# Altium schematic symbol library Kondensator_DIP.SchLib: 1521 symbols (part 3 of 4) (continued)
## Ê50-35-33ÌÊÔ-250Â-1325
designator C?  (value not drawn)
Value: *
footprint Ê50-35-1320_K5035-1R
footprint Ê50-35-1320_K5035-1R1
footprint Ê50-35-1320_Primary
pins: 1, 2

## Ê50-35-33ÌÊÔ-250Â-1325-Ã
designator C?  (value not drawn)
Value: *
footprint Ê50-35-13XX-Ã_K5035-1R
footprint Ê50-35-13XX-Ã_K5035-1R1
footprint Ê50-35-13XX-Ã_Primary
pins: 1, 2

## Ê50-35-33ÌÊÔ-350Â-1326
designator C?  (value not drawn)
Value: *
footprint Ê50-35-1320_K5035-1R
footprint Ê50-35-1320_K5035-1R1
footprint Ê50-35-1320_Primary
pins: 1, 2

## Ê50-35-33ÌÊÔ-350Â-1326-Ã
designator C?  (value not drawn)
Value: *
footprint Ê50-35-13XX-Ã_K5035-1R
footprint Ê50-35-13XX-Ã_K5035-1R1
footprint Ê50-35-13XX-Ã_Primary
pins: 1, 2

## Ê50-35-33ÌÊÔ-350Â-1626
designator C?  (value not drawn)
Value: *
footprint Ê50-35-1625_K5035-1R
footprint Ê50-35-1625_K5035-1R1
footprint Ê50-35-1625_Primary
pins: 1, 2

## Ê50-35-33ÌÊÔ-350Â-1626-Ã
designator C?  (value not drawn)
Value: *
footprint Ê50-35-16XX-Ã_K5035-1R
footprint Ê50-35-16XX-Ã_K5035-1R1
footprint Ê50-35-16XX-Ã_Primary
pins: 1, 2

## Ê50-35-33ÌÊÔ-400Â-1625
designator C?  (value not drawn)
Value: *
footprint Ê50-35-1625_K5035-1R
footprint Ê50-35-1625_K5035-1R1
footprint Ê50-35-1625_Primary
pins: 1, 2

## Ê50-35-33ÌÊÔ-400Â-1625-Ã
designator C?  (value not drawn)
Value: *
footprint Ê50-35-16XX-Ã_K5035-1R
footprint Ê50-35-16XX-Ã_K5035-1R1
footprint Ê50-35-16XX-Ã_Primary
pins: 1, 2

## Ê50-35-33ÌÊÔ-400Â-1633
designator C?  (value not drawn)
Value: *
footprint Ê50-35-1625_K5035-1R
footprint Ê50-35-1625_K5035-1R1
footprint Ê50-35-1625_Primary
pins: 1, 2

## Ê50-35-33ÌÊÔ-400Â-1633-Ã
designator C?  (value not drawn)
Value: *
footprint Ê50-35-16XX-Ã_K5035-1R
footprint Ê50-35-16XX-Ã_K5035-1R1
footprint Ê50-35-16XX-Ã_Primary
pins: 1, 2

## Ê50-35-33ÌÊÔ-450Â-1632
designator C?  (value not drawn)
Value: *
footprint Ê50-35-1625_K5035-1R
footprint Ê50-35-1625_K5035-1R1
footprint Ê50-35-1625_Primary
pins: 1, 2

## Ê50-35-33ÌÊÔ-450Â-1632-Ã
designator C?  (value not drawn)
Value: *
footprint Ê50-35-16XX-Ã_K5035-1R
footprint Ê50-35-16XX-Ã_K5035-1R1
footprint Ê50-35-16XX-Ã_Primary
pins: 1, 2

## Ê50-35-33ÌÊÔ-450Â-1635
designator C?  (value not drawn)
Value: *
footprint Ê50-35-1625_K5035-1R
footprint Ê50-35-1625_K5035-1R1
footprint Ê50-35-1625_Primary
pins: 1, 2

## Ê50-35-33ÌÊÔ-450Â-1635-Ã
designator C?  (value not drawn)
Value: *
footprint Ê50-35-16XX-Ã_K5035-1R
footprint Ê50-35-16XX-Ã_K5035-1R1
footprint Ê50-35-16XX-Ã_Primary
pins: 1, 2

## Ê50-35-47ÌÊÔ-6,3Â
designator C?  (value not drawn)
Value: *
footprint Ê50-35-0511_K5035-1R
footprint Ê50-35-0511_K5035-1R1
footprint Ê50-35-0511_Primary
pins: 1, 2

## Ê50-35-47ÌÊÔ-6.3Â-Ã
designator C?  (value not drawn)
Value: *
footprint Ê50-35-0511-Ã_K5035-1R
footprint Ê50-35-0511-Ã_K5035-1R1
footprint Ê50-35-0511-Ã_Primary
pins: 1, 2

## Ê50-35-47ÌÊÔ-10Â
designator C?  (value not drawn)
Value: *
footprint Ê50-35-0511_K5035-1R
footprint Ê50-35-0511_K5035-1R1
footprint Ê50-35-0511_Primary
pins: 1, 2

## Ê50-35-47ÌÊÔ-10Â-Ã
designator C?  (value not drawn)
Value: *
footprint Ê50-35-0511-Ã_K5035-1R
footprint Ê50-35-0511-Ã_K5035-1R1
footprint Ê50-35-0511-Ã_Primary
pins: 1, 2

## Ê50-35-47ÌÊÔ-16Â
designator C?  (value not drawn)
Value: *
footprint Ê50-35-0511_K5035-1R
footprint Ê50-35-0511_K5035-1R1
footprint Ê50-35-0511_Primary
pins: 1, 2

## Ê50-35-47ÌÊÔ-16Â-Ã
designator C?  (value not drawn)
Value: *
footprint Ê50-35-0511-Ã_K5035-1R
footprint Ê50-35-0511-Ã_K5035-1R1
footprint Ê50-35-0511-Ã_Primary
pins: 1, 2

## Ê50-35-47ÌÊÔ-25Â
designator C?  (value not drawn)
Value: *
footprint Ê50-35-0511_K5035-1R
footprint Ê50-35-0511_K5035-1R1
footprint Ê50-35-0511_Primary
pins: 1, 2

## Ê50-35-47ÌÊÔ-25Â-Ã
designator C?  (value not drawn)
Value: *
footprint Ê50-35-0511-Ã_K5035-1R
footprint Ê50-35-0511-Ã_K5035-1R1
footprint Ê50-35-0511-Ã_Primary
pins: 1, 2

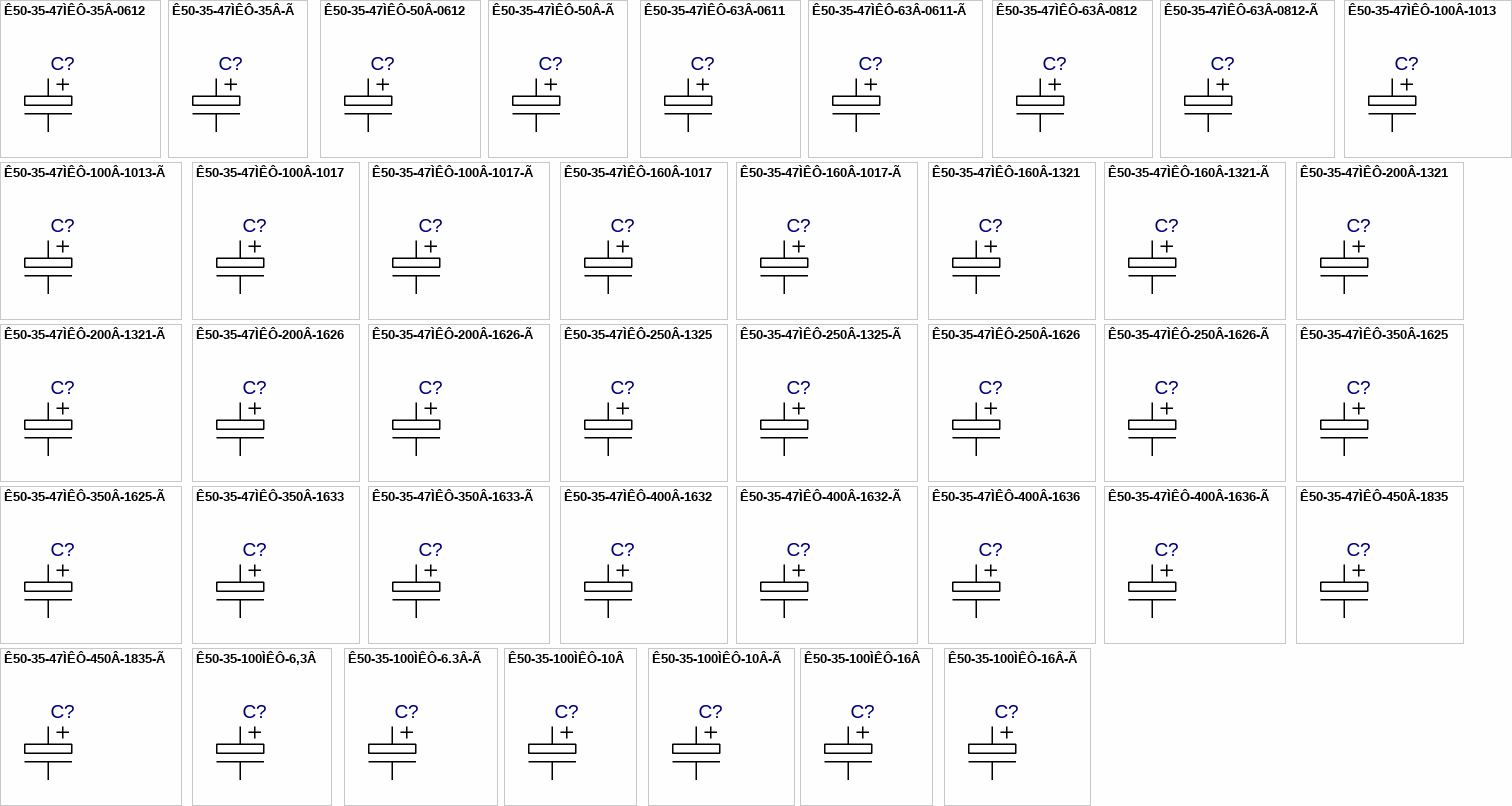
[diagram p28: symbols Ê50-35-47ÌÊÔ-35Â-0612 to Ê50-35-100ÌÊÔ-16Â-Ã]

## Ê50-35-47ÌÊÔ-35Â-0612
designator C?  (value not drawn)
Value: *
footprint Ê50-35-0611_K5035-1R
footprint Ê50-35-0611_K5035-1R1
footprint Ê50-35-0611_Primary
pins: 1, 2

## Ê50-35-47ÌÊÔ-35Â-Ã
designator C?  (value not drawn)
Value: *
footprint Ê50-35-0611-Ã_K5035-1R
footprint Ê50-35-0611-Ã_K5035-1R1
footprint Ê50-35-0611-Ã_Primary
pins: 1, 2

## Ê50-35-47ÌÊÔ-50Â-0612
designator C?  (value not drawn)
Value: *
footprint Ê50-35-0611_K5035-1R
footprint Ê50-35-0611_K5035-1R1
footprint Ê50-35-0611_Primary
pins: 1, 2

## Ê50-35-47ÌÊÔ-50Â-Ã
designator C?  (value not drawn)
Value: *
footprint Ê50-35-0611-Ã_K5035-1R
footprint Ê50-35-0611-Ã_K5035-1R1
footprint Ê50-35-0611-Ã_Primary
pins: 1, 2

## Ê50-35-47ÌÊÔ-63Â-0611
designator C?  (value not drawn)
Value: *
footprint Ê50-35-0611_K5035-1R
footprint Ê50-35-0611_K5035-1R1
footprint Ê50-35-0611_Primary
pins: 1, 2

## Ê50-35-47ÌÊÔ-63Â-0611-Ã
designator C?  (value not drawn)
Value: *
footprint Ê50-35-0611-Ã_K5035-1R
footprint Ê50-35-0611-Ã_K5035-1R1
footprint Ê50-35-0611-Ã_Primary
pins: 1, 2

## Ê50-35-47ÌÊÔ-63Â-0812
designator C?  (value not drawn)
Value: *
footprint R50-35-08XX_K5035-2R
footprint R50-35-08XX_K5035-2R1
footprint R50-35-08XX_Primary
pins: 1, 2

## Ê50-35-47ÌÊÔ-63Â-0812-Ã
designator C?  (value not drawn)
Value: *
footprint Ê50-35-08XX-Ã_K5035-2R
footprint Ê50-35-08XX-Ã_K5035-2R1
footprint Ê50-35-08XX-Ã_Primary
pins: 1, 2

## Ê50-35-47ÌÊÔ-100Â-1013
designator C?  (value not drawn)
Value: *
footprint Ê50-35-1020_K5035-1R
footprint Ê50-35-1020_K5035-1R1
footprint Ê50-35-1020_Primary
pins: 1, 2

## Ê50-35-47ÌÊÔ-100Â-1013-Ã
designator C?  (value not drawn)
Value: *
footprint Ê50-35-1020-Ã_K5035-1R
footprint Ê50-35-1020-Ã_K5035-1R1
footprint Ê50-35-1020-Ã_Primary
pins: 1, 2

## Ê50-35-47ÌÊÔ-100Â-1017
designator C?  (value not drawn)
Value: *
footprint Ê50-35-1020_K5035-1R
footprint Ê50-35-1020_K5035-1R1
footprint Ê50-35-1020_Primary
pins: 1, 2

## Ê50-35-47ÌÊÔ-100Â-1017-Ã
designator C?  (value not drawn)
Value: *
footprint Ê50-35-1020-Ã_K5035-1R
footprint Ê50-35-1020-Ã_K5035-1R1
footprint Ê50-35-1020-Ã_Primary
pins: 1, 2

## Ê50-35-47ÌÊÔ-160Â-1017
designator C?  (value not drawn)
Value: *
footprint Ê50-35-1020_K5035-1R
footprint Ê50-35-1020_K5035-1R1
footprint Ê50-35-1020_Primary
pins: 1, 2

## Ê50-35-47ÌÊÔ-160Â-1017-Ã
designator C?  (value not drawn)
Value: *
footprint Ê50-35-1020-Ã_K5035-1R
footprint Ê50-35-1020-Ã_K5035-1R1
footprint Ê50-35-1020-Ã_Primary
pins: 1, 2

## Ê50-35-47ÌÊÔ-160Â-1321
designator C?  (value not drawn)
Value: *
footprint Ê50-35-1320_K5035-1R
footprint Ê50-35-1320_K5035-1R1
footprint Ê50-35-1320_Primary
pins: 1, 2

## Ê50-35-47ÌÊÔ-160Â-1321-Ã
designator C?  (value not drawn)
Value: *
footprint Ê50-35-13XX-Ã_K5035-1R
footprint Ê50-35-13XX-Ã_K5035-1R1
footprint Ê50-35-13XX-Ã_Primary
pins: 1, 2

## Ê50-35-47ÌÊÔ-200Â-1321
designator C?  (value not drawn)
Value: *
footprint Ê50-35-1320_K5035-1R
footprint Ê50-35-1320_K5035-1R1
footprint Ê50-35-1320_Primary
pins: 1, 2

## Ê50-35-47ÌÊÔ-200Â-1321-Ã
designator C?  (value not drawn)
Value: *
footprint Ê50-35-13XX-Ã_K5035-1R
footprint Ê50-35-13XX-Ã_K5035-1R1
footprint Ê50-35-13XX-Ã_Primary
pins: 1, 2

## Ê50-35-47ÌÊÔ-200Â-1626
designator C?  (value not drawn)
Value: *
footprint Ê50-35-1625_K5035-1R
footprint Ê50-35-1625_K5035-1R1
footprint Ê50-35-1625_Primary
pins: 1, 2

## Ê50-35-47ÌÊÔ-200Â-1626-Ã
designator C?  (value not drawn)
Value: *
footprint Ê50-35-16XX-Ã_K5035-1R
footprint Ê50-35-16XX-Ã_K5035-1R1
footprint Ê50-35-16XX-Ã_Primary
pins: 1, 2

## Ê50-35-47ÌÊÔ-250Â-1325
designator C?  (value not drawn)
Value: *
footprint Ê50-35-1320_K5035-1R
footprint Ê50-35-1320_K5035-1R1
footprint Ê50-35-1320_Primary
pins: 1, 2

## Ê50-35-47ÌÊÔ-250Â-1325-Ã
designator C?  (value not drawn)
Value: *
footprint Ê50-35-13XX-Ã_K5035-1R
footprint Ê50-35-13XX-Ã_K5035-1R1
footprint Ê50-35-13XX-Ã_Primary
pins: 1, 2

## Ê50-35-47ÌÊÔ-250Â-1626
designator C?  (value not drawn)
Value: *
footprint Ê50-35-1625_K5035-1R
footprint Ê50-35-1625_K5035-1R1
footprint Ê50-35-1625_Primary
pins: 1, 2

## Ê50-35-47ÌÊÔ-250Â-1626-Ã
designator C?  (value not drawn)
Value: *
footprint Ê50-35-16XX-Ã_K5035-1R
footprint Ê50-35-16XX-Ã_K5035-1R1
footprint Ê50-35-16XX-Ã_Primary
pins: 1, 2

## Ê50-35-47ÌÊÔ-350Â-1625
designator C?  (value not drawn)
Value: *
footprint Ê50-35-1625_K5035-1R
footprint Ê50-35-1625_K5035-1R1
footprint Ê50-35-1625_Primary
pins: 1, 2

## Ê50-35-47ÌÊÔ-350Â-1625-Ã
designator C?  (value not drawn)
Value: *
footprint Ê50-35-16XX-Ã_K5035-1R
footprint Ê50-35-16XX-Ã_K5035-1R1
footprint Ê50-35-16XX-Ã_Primary
pins: 1, 2

## Ê50-35-47ÌÊÔ-350Â-1633
designator C?  (value not drawn)
Value: *
footprint Ê50-35-1625_K5035-1R
footprint Ê50-35-1625_K5035-1R1
footprint Ê50-35-1625_Primary
pins: 1, 2

## Ê50-35-47ÌÊÔ-350Â-1633-Ã
designator C?  (value not drawn)
Value: *
footprint Ê50-35-16XX-Ã_K5035-1R
footprint Ê50-35-16XX-Ã_K5035-1R1
footprint Ê50-35-16XX-Ã_Primary
pins: 1, 2

## Ê50-35-47ÌÊÔ-400Â-1632
designator C?  (value not drawn)
Value: *
footprint Ê50-35-1625_K5035-1R
footprint Ê50-35-1625_K5035-1R1
footprint Ê50-35-1625_Primary
pins: 1, 2

## Ê50-35-47ÌÊÔ-400Â-1632-Ã
designator C?  (value not drawn)
Value: *
footprint Ê50-35-16XX-Ã_K5035-1R
footprint Ê50-35-16XX-Ã_K5035-1R1
footprint Ê50-35-16XX-Ã_Primary
pins: 1, 2

## Ê50-35-47ÌÊÔ-400Â-1636
designator C?  (value not drawn)
Value: *
footprint Ê50-35-1625_K5035-1R
footprint Ê50-35-1625_K5035-1R1
footprint Ê50-35-1625_Primary
pins: 1, 2

## Ê50-35-47ÌÊÔ-400Â-1636-Ã
designator C?  (value not drawn)
Value: *
footprint Ê50-35-16XX-Ã_K5035-1R
footprint Ê50-35-16XX-Ã_K5035-1R1
footprint Ê50-35-16XX-Ã_Primary
pins: 1, 2

## Ê50-35-47ÌÊÔ-450Â-1835
designator C?  (value not drawn)
Value: *
footprint Ê50-35-1835_K5035-1R
footprint Ê50-35-1835_K5035-1R1
footprint Ê50-35-1835_Primary
pins: 1, 2

## Ê50-35-47ÌÊÔ-450Â-1835-Ã
designator C?  (value not drawn)
Value: *
footprint Ê50-35-18XX-Ã_K5035-1R
footprint Ê50-35-18XX-Ã_K5035-1R1
footprint Ê50-35-18XX-Ã_Primary
pins: 1, 2

## Ê50-35-100ÌÊÔ-6,3Â
designator C?  (value not drawn)
Value: *
footprint Ê50-35-0511_K5035-1R
footprint Ê50-35-0511_K5035-1R1
footprint Ê50-35-0511_Primary
pins: 1, 2

## Ê50-35-100ÌÊÔ-6.3Â-Ã
designator C?  (value not drawn)
Value: *
footprint Ê50-35-0511-Ã_K5035-1R
footprint Ê50-35-0511-Ã_K5035-1R1
footprint Ê50-35-0511-Ã_Primary
pins: 1, 2

## Ê50-35-100ÌÊÔ-10Â
designator C?  (value not drawn)
Value: *
footprint Ê50-35-0511_K5035-1R
footprint Ê50-35-0511_K5035-1R1
footprint Ê50-35-0511_Primary
pins: 1, 2

## Ê50-35-100ÌÊÔ-10Â-Ã
designator C?  (value not drawn)
Value: *
footprint Ê50-35-0511-Ã_K5035-1R
footprint Ê50-35-0511-Ã_K5035-1R1
footprint Ê50-35-0511-Ã_Primary
pins: 1, 2

## Ê50-35-100ÌÊÔ-16Â
designator C?  (value not drawn)
Value: *
footprint Ê50-35-0511_K5035-1R
footprint Ê50-35-0511_K5035-1R1
footprint Ê50-35-0511_Primary
pins: 1, 2

## Ê50-35-100ÌÊÔ-16Â-Ã
designator C?  (value not drawn)
Value: *
footprint Ê50-35-0511-Ã_K5035-1R
footprint Ê50-35-0511-Ã_K5035-1R1
footprint Ê50-35-0511-Ã_Primary
pins: 1, 2

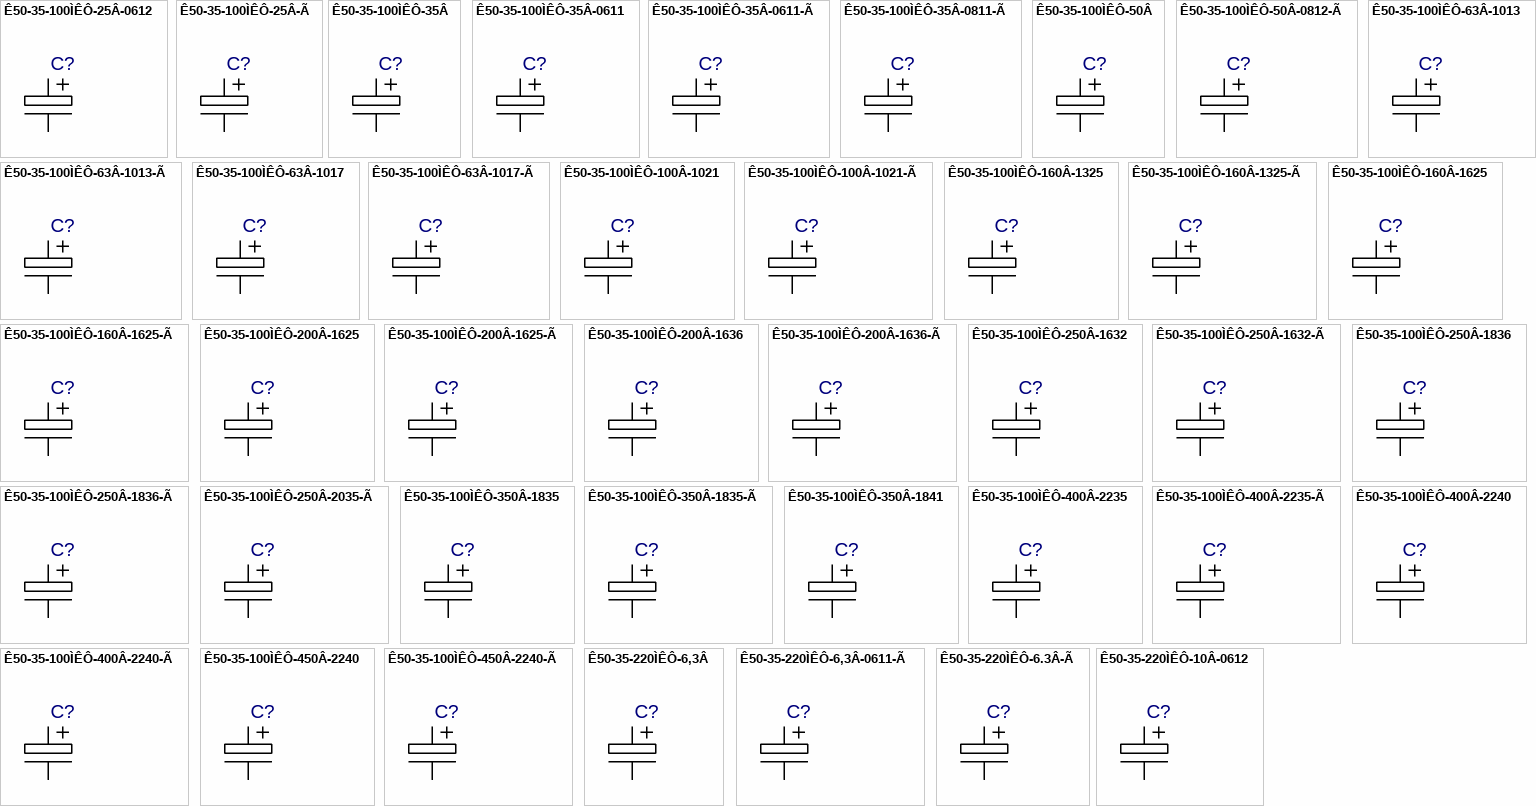
[diagram p29: symbols Ê50-35-100ÌÊÔ-25Â-0612 to Ê50-35-220ÌÊÔ-10Â-0612]

## Ê50-35-100ÌÊÔ-25Â-0612
designator C?  (value not drawn)
Value: *
footprint Ê50-35-0611_K5035-1R
footprint Ê50-35-0611_K5035-1R1
footprint Ê50-35-0611_Primary
pins: 1, 2

## Ê50-35-100ÌÊÔ-25Â-Ã
designator C?  (value not drawn)
Value: *
footprint Ê50-35-0611-Ã_K5035-1R
footprint Ê50-35-0611-Ã_K5035-1R1
footprint Ê50-35-0611-Ã_Primary
pins: 1, 2

## Ê50-35-100ÌÊÔ-35Â
designator C?  (value not drawn)
Value: *
footprint R50-35-08XX_K5035-2R
footprint R50-35-08XX_K5035-2R1
footprint R50-35-08XX_Primary
pins: 1, 2

## Ê50-35-100ÌÊÔ-35Â-0611
designator C?  (value not drawn)
Value: *
footprint Ê50-35-0611_K5035-1R
footprint Ê50-35-0611_K5035-1R1
footprint Ê50-35-0611_Primary
pins: 1, 2

## Ê50-35-100ÌÊÔ-35Â-0611-Ã
designator C?  (value not drawn)
Value: *
footprint Ê50-35-0611-Ã_K5035-1R
footprint Ê50-35-0611-Ã_K5035-1R1
footprint Ê50-35-0611-Ã_Primary
pins: 1, 2

## Ê50-35-100ÌÊÔ-35Â-0811-Ã
designator C?  (value not drawn)
Value: *
footprint Ê50-35-08XX-Ã_K5035-2R
footprint Ê50-35-08XX-Ã_K5035-2R1
footprint Ê50-35-08XX-Ã_Primary
pins: 1, 2

## Ê50-35-100ÌÊÔ-50Â
designator C?  (value not drawn)
Value: *
footprint R50-35-08XX_K5035-2R
footprint R50-35-08XX_K5035-2R1
footprint R50-35-08XX_Primary
pins: 1, 2

## Ê50-35-100ÌÊÔ-50Â-0812-Ã
designator C?  (value not drawn)
Value: *
footprint Ê50-35-08XX-Ã_K5035-2R
footprint Ê50-35-08XX-Ã_K5035-2R1
footprint Ê50-35-08XX-Ã_Primary
pins: 1, 2

## Ê50-35-100ÌÊÔ-63Â-1013
designator C?  (value not drawn)
Value: *
footprint Ê50-35-1020_K5035-1R
footprint Ê50-35-1020_K5035-1R1
footprint Ê50-35-1020_Primary
pins: 1, 2

## Ê50-35-100ÌÊÔ-63Â-1013-Ã
designator C?  (value not drawn)
Value: *
footprint Ê50-35-1020-Ã_K5035-1R
footprint Ê50-35-1020-Ã_K5035-1R1
footprint Ê50-35-1020-Ã_Primary
pins: 1, 2

## Ê50-35-100ÌÊÔ-63Â-1017
designator C?  (value not drawn)
Value: *
footprint Ê50-35-1020_K5035-1R
footprint Ê50-35-1020_K5035-1R1
footprint Ê50-35-1020_Primary
pins: 1, 2

## Ê50-35-100ÌÊÔ-63Â-1017-Ã
designator C?  (value not drawn)
Value: *
footprint Ê50-35-1020-Ã_K5035-1R
footprint Ê50-35-1020-Ã_K5035-1R1
footprint Ê50-35-1020-Ã_Primary
pins: 1, 2

## Ê50-35-100ÌÊÔ-100Â-1021
designator C?  (value not drawn)
Value: *
footprint Ê50-35-1020_K5035-1R
footprint Ê50-35-1020_K5035-1R1
footprint Ê50-35-1020_Primary
pins: 1, 2

## Ê50-35-100ÌÊÔ-100Â-1021-Ã
designator C?  (value not drawn)
Value: *
footprint Ê50-35-1020-Ã_K5035-1R
footprint Ê50-35-1020-Ã_K5035-1R1
footprint Ê50-35-1020-Ã_Primary
pins: 1, 2

## Ê50-35-100ÌÊÔ-160Â-1325
designator C?  (value not drawn)
Value: *
footprint Ê50-35-1320_K5035-1R
footprint Ê50-35-1320_K5035-1R1
footprint Ê50-35-1320_Primary
pins: 1, 2

## Ê50-35-100ÌÊÔ-160Â-1325-Ã
designator C?  (value not drawn)
Value: *
footprint Ê50-35-13XX-Ã_K5035-1R
footprint Ê50-35-13XX-Ã_K5035-1R1
footprint Ê50-35-13XX-Ã_Primary
pins: 1, 2

## Ê50-35-100ÌÊÔ-160Â-1625
designator C?  (value not drawn)
Value: *
footprint Ê50-35-1625_K5035-1R
footprint Ê50-35-1625_K5035-1R1
footprint Ê50-35-1625_Primary
pins: 1, 2

## Ê50-35-100ÌÊÔ-160Â-1625-Ã
designator C?  (value not drawn)
Value: *
footprint Ê50-35-16XX-Ã_K5035-1R
footprint Ê50-35-16XX-Ã_K5035-1R1
footprint Ê50-35-16XX-Ã_Primary
pins: 1, 2

## Ê50-35-100ÌÊÔ-200Â-1625
designator C?  (value not drawn)
Value: *
footprint Ê50-35-1625_K5035-1R
footprint Ê50-35-1625_K5035-1R1
footprint Ê50-35-1625_Primary
pins: 1, 2

## Ê50-35-100ÌÊÔ-200Â-1625-Ã
designator C?  (value not drawn)
Value: *
footprint Ê50-35-16XX-Ã_K5035-1R
footprint Ê50-35-16XX-Ã_K5035-1R1
footprint Ê50-35-16XX-Ã_Primary
pins: 1, 2

## Ê50-35-100ÌÊÔ-200Â-1636
designator C?  (value not drawn)
Value: *
footprint Ê50-35-1625_K5035-1R
footprint Ê50-35-1625_K5035-1R1
footprint Ê50-35-1625_Primary
pins: 1, 2

## Ê50-35-100ÌÊÔ-200Â-1636-Ã
designator C?  (value not drawn)
Value: *
footprint Ê50-35-16XX-Ã_K5035-1R
footprint Ê50-35-16XX-Ã_K5035-1R1
footprint Ê50-35-16XX-Ã_Primary
pins: 1, 2

## Ê50-35-100ÌÊÔ-250Â-1632
designator C?  (value not drawn)
Value: *
footprint Ê50-35-1625_K5035-1R
footprint Ê50-35-1625_K5035-1R1
footprint Ê50-35-1625_Primary
pins: 1, 2

## Ê50-35-100ÌÊÔ-250Â-1632-Ã
designator C?  (value not drawn)
Value: *
footprint Ê50-35-16XX-Ã_K5035-1R
footprint Ê50-35-16XX-Ã_K5035-1R1
footprint Ê50-35-16XX-Ã_Primary
pins: 1, 2

## Ê50-35-100ÌÊÔ-250Â-1836
designator C?  (value not drawn)
Value: *
footprint Ê50-35-1835_K5035-1R
footprint Ê50-35-1835_K5035-1R1
footprint Ê50-35-1835_Primary
pins: 1, 2

## Ê50-35-100ÌÊÔ-250Â-1836-Ã
designator C?  (value not drawn)
Value: *
footprint Ê50-35-18XX-Ã_K5035-1R
footprint Ê50-35-18XX-Ã_K5035-1R1
footprint Ê50-35-18XX-Ã_Primary
pins: 1, 2

## Ê50-35-100ÌÊÔ-250Â-2035-Ã
designator C?  (value not drawn)
Value: *
footprint Ê50-35-20XX-Ã_K5035-1R
footprint Ê50-35-20XX-Ã_K5035-1R1
footprint Ê50-35-20XX-Ã_Primary
pins: 1, 2

## Ê50-35-100ÌÊÔ-350Â-1835
designator C?  (value not drawn)
Value: *
footprint Ê50-35-1835_K5035-1R
footprint Ê50-35-1835_K5035-1R1
footprint Ê50-35-1835_Primary
pins: 1, 2

## Ê50-35-100ÌÊÔ-350Â-1835-Ã
designator C?  (value not drawn)
Value: *
footprint Ê50-35-18XX-Ã_K5035-1R
footprint Ê50-35-18XX-Ã_K5035-1R1
footprint Ê50-35-18XX-Ã_Primary
pins: 1, 2

## Ê50-35-100ÌÊÔ-350Â-1841
designator C?  (value not drawn)
Value: *
footprint Ê50-35-1835_K5035-1R
footprint Ê50-35-1835_K5035-1R1
footprint Ê50-35-1835_Primary
pins: 1, 2

## Ê50-35-100ÌÊÔ-400Â-2235
designator C?  (value not drawn)
Value: *
footprint Ê50-35-2240_K5035-1R
footprint Ê50-35-2240_K5035-1R1
footprint Ê50-35-2240_Primary
pins: 1, 2

## Ê50-35-100ÌÊÔ-400Â-2235-Ã
designator C?  (value not drawn)
Value: *
footprint Ê50-35-22XX-Ã_K5035-1R
footprint Ê50-35-22XX-Ã_K5035-1R1
footprint Ê50-35-22XX-Ã_Primary
pins: 1, 2

## Ê50-35-100ÌÊÔ-400Â-2240
designator C?  (value not drawn)
Value: *
footprint Ê50-35-2240_K5035-1R
footprint Ê50-35-2240_K5035-1R1
footprint Ê50-35-2240_Primary
pins: 1, 2

## Ê50-35-100ÌÊÔ-400Â-2240-Ã
designator C?  (value not drawn)
Value: *
footprint Ê50-35-22XX-Ã_K5035-1R
footprint Ê50-35-22XX-Ã_K5035-1R1
footprint Ê50-35-22XX-Ã_Primary
pins: 1, 2

## Ê50-35-100ÌÊÔ-450Â-2240
designator C?  (value not drawn)
Value: *
footprint Ê50-35-2240_K5035-1R
footprint Ê50-35-2240_K5035-1R1
footprint Ê50-35-2240_Primary
pins: 1, 2

## Ê50-35-100ÌÊÔ-450Â-2240-Ã
designator C?  (value not drawn)
Value: *
footprint Ê50-35-22XX-Ã_K5035-1R
footprint Ê50-35-22XX-Ã_K5035-1R1
footprint Ê50-35-22XX-Ã_Primary
pins: 1, 2

## Ê50-35-220ÌÊÔ-6,3Â
designator C?  (value not drawn)
Value: *
footprint Ê50-35-0511_K5035-1R
footprint Ê50-35-0511_K5035-1R1
footprint Ê50-35-0511_Primary
pins: 1, 2

## Ê50-35-220ÌÊÔ-6,3Â-0611-Ã
designator C?  (value not drawn)
Value: *
footprint Ê50-35-0611-Ã_K5035-1R
footprint Ê50-35-0611-Ã_K5035-1R1
footprint Ê50-35-0611-Ã_Primary
pins: 1, 2

## Ê50-35-220ÌÊÔ-6.3Â-Ã
designator C?  (value not drawn)
Value: *
footprint Ê50-35-0511-Ã_K5035-1R
footprint Ê50-35-0511-Ã_K5035-1R1
footprint Ê50-35-0511-Ã_Primary
pins: 1, 2

## Ê50-35-220ÌÊÔ-10Â-0612
designator C?  (value not drawn)
Value: *
footprint Ê50-35-0611_K5035-1R
footprint Ê50-35-0611_K5035-1R1
footprint Ê50-35-0611_Primary
pins: 1, 2

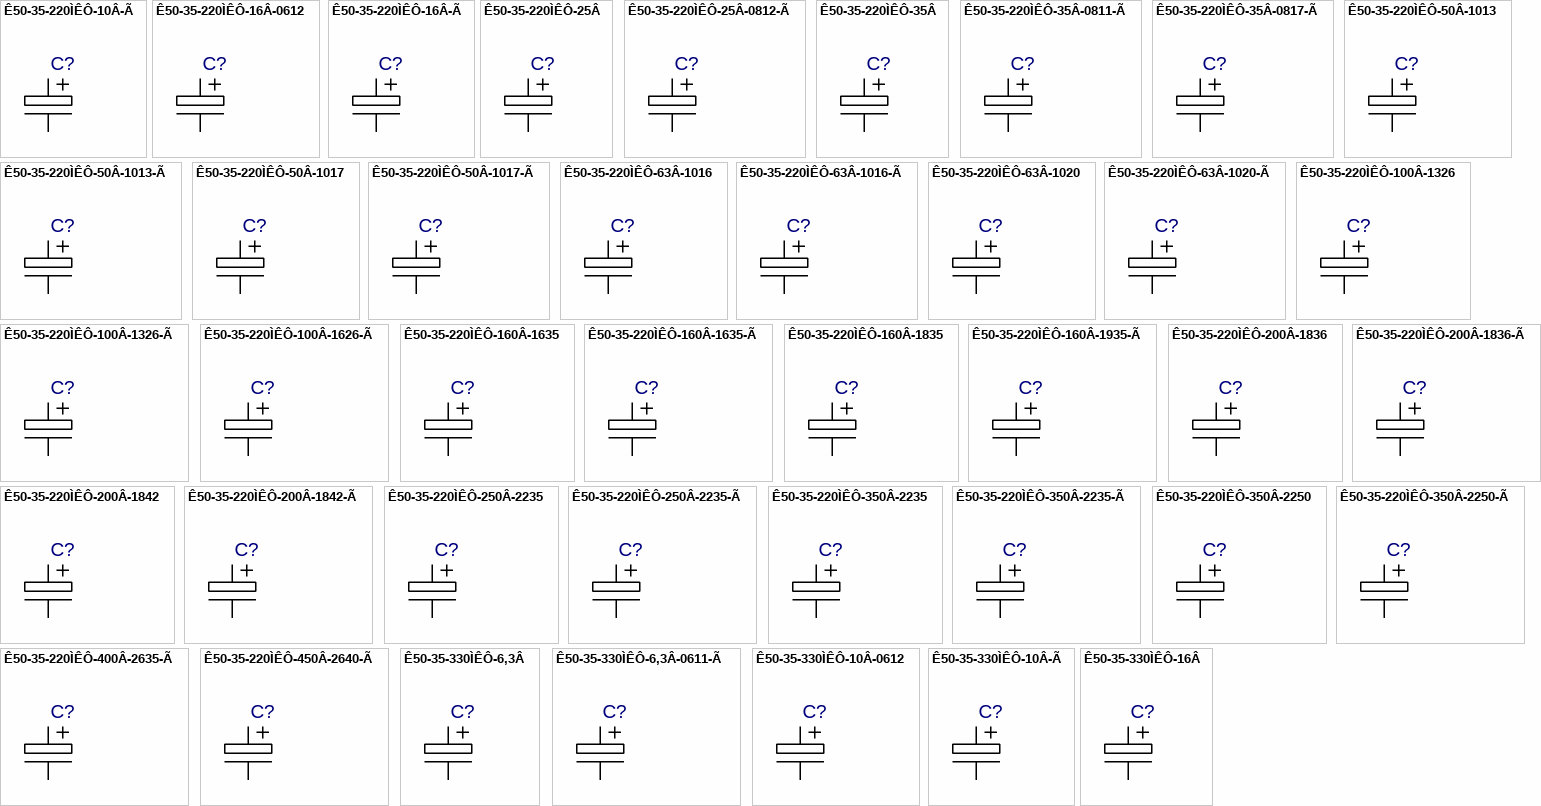
[diagram p30: symbols Ê50-35-220ÌÊÔ-10Â-Ã to Ê50-35-330ÌÊÔ-16Â]

## Ê50-35-220ÌÊÔ-10Â-Ã
designator C?  (value not drawn)
Value: *
footprint Ê50-35-0611-Ã_K5035-1R
footprint Ê50-35-0611-Ã_K5035-1R1
footprint Ê50-35-0611-Ã_Primary
pins: 1, 2

## Ê50-35-220ÌÊÔ-16Â-0612
designator C?  (value not drawn)
Value: *
footprint Ê50-35-0611_K5035-1R
footprint Ê50-35-0611_K5035-1R1
footprint Ê50-35-0611_Primary
pins: 1, 2

## Ê50-35-220ÌÊÔ-16Â-Ã
designator C?  (value not drawn)
Value: *
footprint Ê50-35-0611-Ã_K5035-1R
footprint Ê50-35-0611-Ã_K5035-1R1
footprint Ê50-35-0611-Ã_Primary
pins: 1, 2

## Ê50-35-220ÌÊÔ-25Â
designator C?  (value not drawn)
Value: *
footprint R50-35-08XX_K5035-2R
footprint R50-35-08XX_K5035-2R1
footprint R50-35-08XX_Primary
pins: 1, 2

## Ê50-35-220ÌÊÔ-25Â-0812-Ã
designator C?  (value not drawn)
Value: *
footprint Ê50-35-08XX-Ã_K5035-2R
footprint Ê50-35-08XX-Ã_K5035-2R1
footprint Ê50-35-08XX-Ã_Primary
pins: 1, 2

## Ê50-35-220ÌÊÔ-35Â
designator C?  (value not drawn)
Value: *
footprint R50-35-08XX_K5035-2R
footprint R50-35-08XX_K5035-2R1
footprint R50-35-08XX_Primary
pins: 1, 2

## Ê50-35-220ÌÊÔ-35Â-0811-Ã
designator C?  (value not drawn)
Value: *
footprint Ê50-35-08XX-Ã_K5035-2R
footprint Ê50-35-08XX-Ã_K5035-2R1
footprint Ê50-35-08XX-Ã_Primary
pins: 1, 2

## Ê50-35-220ÌÊÔ-35Â-0817-Ã
designator C?  (value not drawn)
Value: *
footprint Ê50-35-08XX-Ã_K5035-2R
footprint Ê50-35-08XX-Ã_K5035-2R1
footprint Ê50-35-08XX-Ã_Primary
pins: 1, 2

## Ê50-35-220ÌÊÔ-50Â-1013
designator C?  (value not drawn)
Value: *
footprint Ê50-35-1020_K5035-1R
footprint Ê50-35-1020_K5035-1R1
footprint Ê50-35-1020_Primary
pins: 1, 2

## Ê50-35-220ÌÊÔ-50Â-1013-Ã
designator C?  (value not drawn)
Value: *
footprint Ê50-35-1020-Ã_K5035-1R
footprint Ê50-35-1020-Ã_K5035-1R1
footprint Ê50-35-1020-Ã_Primary
pins: 1, 2

## Ê50-35-220ÌÊÔ-50Â-1017
designator C?  (value not drawn)
Value: *
footprint Ê50-35-1020_K5035-1R
footprint Ê50-35-1020_K5035-1R1
footprint Ê50-35-1020_Primary
pins: 1, 2

## Ê50-35-220ÌÊÔ-50Â-1017-Ã
designator C?  (value not drawn)
Value: *
footprint Ê50-35-1020-Ã_K5035-1R
footprint Ê50-35-1020-Ã_K5035-1R1
footprint Ê50-35-1020-Ã_Primary
pins: 1, 2

## Ê50-35-220ÌÊÔ-63Â-1016
designator C?  (value not drawn)
Value: *
footprint Ê50-35-1020_K5035-1R
footprint Ê50-35-1020_K5035-1R1
footprint Ê50-35-1020_Primary
pins: 1, 2

## Ê50-35-220ÌÊÔ-63Â-1016-Ã
designator C?  (value not drawn)
Value: *
footprint Ê50-35-1020-Ã_K5035-1R
footprint Ê50-35-1020-Ã_K5035-1R1
footprint Ê50-35-1020-Ã_Primary
pins: 1, 2

## Ê50-35-220ÌÊÔ-63Â-1020
designator C?  (value not drawn)
Value: *
footprint Ê50-35-1020_K5035-1R
footprint Ê50-35-1020_K5035-1R1
footprint Ê50-35-1020_Primary
pins: 1, 2

## Ê50-35-220ÌÊÔ-63Â-1020-Ã
designator C?  (value not drawn)
Value: *
footprint Ê50-35-1020-Ã_K5035-1R
footprint Ê50-35-1020-Ã_K5035-1R1
footprint Ê50-35-1020-Ã_Primary
pins: 1, 2

## Ê50-35-220ÌÊÔ-100Â-1326
designator C?  (value not drawn)
Value: *
footprint Ê50-35-1320_K5035-1R
footprint Ê50-35-1320_K5035-1R1
footprint Ê50-35-1320_Primary
pins: 1, 2

## Ê50-35-220ÌÊÔ-100Â-1326-Ã
designator C?  (value not drawn)
Value: *
footprint Ê50-35-13XX-Ã_K5035-1R
footprint Ê50-35-13XX-Ã_K5035-1R1
footprint Ê50-35-13XX-Ã_Primary
pins: 1, 2

## Ê50-35-220ÌÊÔ-100Â-1626-Ã
designator C?  (value not drawn)
Value: *
footprint Ê50-35-16XX-Ã_K5035-1R
footprint Ê50-35-16XX-Ã_K5035-1R1
footprint Ê50-35-16XX-Ã_Primary
pins: 1, 2

## Ê50-35-220ÌÊÔ-160Â-1635
designator C?  (value not drawn)
Value: *
footprint Ê50-35-1625_K5035-1R
footprint Ê50-35-1625_K5035-1R1
footprint Ê50-35-1625_Primary
pins: 1, 2

## Ê50-35-220ÌÊÔ-160Â-1635-Ã
designator C?  (value not drawn)
Value: *
footprint Ê50-35-16XX-Ã_K5035-1R
footprint Ê50-35-16XX-Ã_K5035-1R1
footprint Ê50-35-16XX-Ã_Primary
pins: 1, 2

## Ê50-35-220ÌÊÔ-160Â-1835
designator C?  (value not drawn)
Value: *
footprint Ê50-35-1835_K5035-1R
footprint Ê50-35-1835_K5035-1R1
footprint Ê50-35-1835_Primary
pins: 1, 2

## Ê50-35-220ÌÊÔ-160Â-1935-Ã
designator C?  (value not drawn)
Value: *
footprint Ê50-35-18XX-Ã_K5035-1R
footprint Ê50-35-18XX-Ã_K5035-1R1
footprint Ê50-35-18XX-Ã_Primary
pins: 1, 2

## Ê50-35-220ÌÊÔ-200Â-1836
designator C?  (value not drawn)
Value: *
footprint Ê50-35-1835_K5035-1R
footprint Ê50-35-1835_K5035-1R1
footprint Ê50-35-1835_Primary
pins: 1, 2

## Ê50-35-220ÌÊÔ-200Â-1836-Ã
designator C?  (value not drawn)
Value: *
footprint Ê50-35-18XX-Ã_K5035-1R
footprint Ê50-35-18XX-Ã_K5035-1R1
footprint Ê50-35-18XX-Ã_Primary
pins: 1, 2

## Ê50-35-220ÌÊÔ-200Â-1842
designator C?  (value not drawn)
Value: *
footprint Ê50-35-1835_K5035-1R
footprint Ê50-35-1835_K5035-1R1
footprint Ê50-35-1835_Primary
pins: 1, 2

## Ê50-35-220ÌÊÔ-200Â-1842-Ã
designator C?  (value not drawn)
Value: *
footprint Ê50-35-18XX-Ã_K5035-1R
footprint Ê50-35-18XX-Ã_K5035-1R1
footprint Ê50-35-18XX-Ã_Primary
pins: 1, 2

## Ê50-35-220ÌÊÔ-250Â-2235
designator C?  (value not drawn)
Value: *
footprint Ê50-35-2240_K5035-1R
footprint Ê50-35-2240_K5035-1R1
footprint Ê50-35-2240_Primary
pins: 1, 2

## Ê50-35-220ÌÊÔ-250Â-2235-Ã
designator C?  (value not drawn)
Value: *
footprint Ê50-35-22XX-Ã_K5035-1R
footprint Ê50-35-22XX-Ã_K5035-1R1
footprint Ê50-35-22XX-Ã_Primary
pins: 1, 2

## Ê50-35-220ÌÊÔ-350Â-2235
designator C?  (value not drawn)
Value: *
footprint Ê50-35-2240_K5035-1R
footprint Ê50-35-2240_K5035-1R1
footprint Ê50-35-2240_Primary
pins: 1, 2

## Ê50-35-220ÌÊÔ-350Â-2235-Ã
designator C?  (value not drawn)
Value: *
footprint Ê50-35-22XX-Ã_K5035-1R
footprint Ê50-35-22XX-Ã_K5035-1R1
footprint Ê50-35-22XX-Ã_Primary
pins: 1, 2

## Ê50-35-220ÌÊÔ-350Â-2250
designator C?  (value not drawn)
Value: *
footprint Ê50-35-2240_K5035-1R
footprint Ê50-35-2240_K5035-1R1
footprint Ê50-35-2240_Primary
pins: 1, 2

## Ê50-35-220ÌÊÔ-350Â-2250-Ã
designator C?  (value not drawn)
Value: *
footprint Ê50-35-22XX-Ã_K5035-1R
footprint Ê50-35-22XX-Ã_K5035-1R1
footprint Ê50-35-22XX-Ã_Primary
pins: 1, 2

## Ê50-35-220ÌÊÔ-400Â-2635-Ã
designator C?  (value not drawn)
Value: *
footprint Ê50-35-26XX-Ã_K5035-1R
footprint Ê50-35-26XX-Ã_K5035-1R1
footprint Ê50-35-26XX-Ã_Primary
pins: 1, 2

## Ê50-35-220ÌÊÔ-450Â-2640-Ã
designator C?  (value not drawn)
Value: *
footprint Ê50-35-26XX-Ã_K5035-1R
footprint Ê50-35-26XX-Ã_K5035-1R1
footprint Ê50-35-26XX-Ã_Primary
pins: 1, 2

## Ê50-35-330ÌÊÔ-6,3Â
designator C?  (value not drawn)
Value: *
footprint Ê50-35-0611_K5035-1R
footprint Ê50-35-0611_K5035-1R1
footprint Ê50-35-0611_Primary
pins: 1, 2

## Ê50-35-330ÌÊÔ-6,3Â-0611-Ã
designator C?  (value not drawn)
Value: *
footprint Ê50-35-0611-Ã_K5035-1R
footprint Ê50-35-0611-Ã_K5035-1R1
footprint Ê50-35-0611-Ã_Primary
pins: 1, 2

## Ê50-35-330ÌÊÔ-10Â-0612
designator C?  (value not drawn)
Value: *
footprint Ê50-35-0611_K5035-1R
footprint Ê50-35-0611_K5035-1R1
footprint Ê50-35-0611_Primary
pins: 1, 2

## Ê50-35-330ÌÊÔ-10Â-Ã
designator C?  (value not drawn)
Value: *
footprint Ê50-35-0611-Ã_K5035-1R
footprint Ê50-35-0611-Ã_K5035-1R1
footprint Ê50-35-0611-Ã_Primary
pins: 1, 2

## Ê50-35-330ÌÊÔ-16Â
designator C?  (value not drawn)
Value: *
footprint R50-35-08XX_K5035-2R
footprint R50-35-08XX_K5035-2R1
footprint R50-35-08XX_Primary
pins: 1, 2

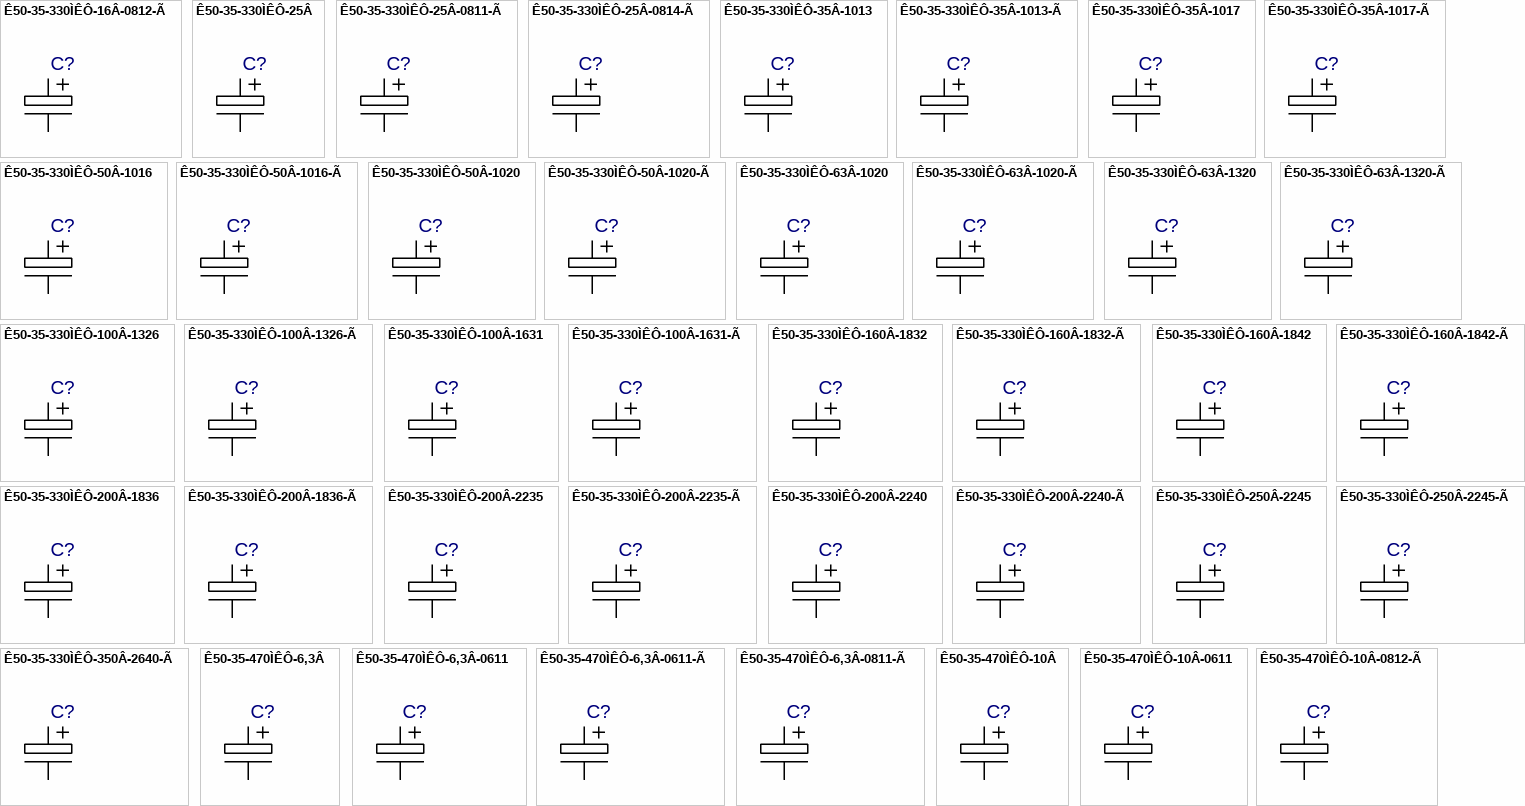
[diagram p31: symbols Ê50-35-330ÌÊÔ-16Â-0812-Ã to Ê50-35-470ÌÊÔ-10Â-0812-Ã]

## Ê50-35-330ÌÊÔ-16Â-0812-Ã
designator C?  (value not drawn)
Value: *
footprint Ê50-35-08XX-Ã_K5035-2R
footprint Ê50-35-08XX-Ã_K5035-2R1
footprint Ê50-35-08XX-Ã_Primary
pins: 1, 2

## Ê50-35-330ÌÊÔ-25Â
designator C?  (value not drawn)
Value: *
footprint R50-35-08XX_K5035-2R
footprint R50-35-08XX_K5035-2R1
footprint R50-35-08XX_Primary
pins: 1, 2

## Ê50-35-330ÌÊÔ-25Â-0811-Ã
designator C?  (value not drawn)
Value: *
footprint Ê50-35-08XX-Ã_K5035-2R
footprint Ê50-35-08XX-Ã_K5035-2R1
footprint Ê50-35-08XX-Ã_Primary
pins: 1, 2

## Ê50-35-330ÌÊÔ-25Â-0814-Ã
designator C?  (value not drawn)
Value: *
footprint Ê50-35-08XX-Ã_K5035-2R
footprint Ê50-35-08XX-Ã_K5035-2R1
footprint Ê50-35-08XX-Ã_Primary
pins: 1, 2

## Ê50-35-330ÌÊÔ-35Â-1013
designator C?  (value not drawn)
Value: *
footprint Ê50-35-1020_K5035-1R
footprint Ê50-35-1020_K5035-1R1
footprint Ê50-35-1020_Primary
pins: 1, 2

## Ê50-35-330ÌÊÔ-35Â-1013-Ã
designator C?  (value not drawn)
Value: *
footprint Ê50-35-1020-Ã_K5035-1R
footprint Ê50-35-1020-Ã_K5035-1R1
footprint Ê50-35-1020-Ã_Primary
pins: 1, 2

## Ê50-35-330ÌÊÔ-35Â-1017
designator C?  (value not drawn)
Value: *
footprint Ê50-35-1020_K5035-1R
footprint Ê50-35-1020_K5035-1R1
footprint Ê50-35-1020_Primary
pins: 1, 2

## Ê50-35-330ÌÊÔ-35Â-1017-Ã
designator C?  (value not drawn)
Value: *
footprint Ê50-35-1020-Ã_K5035-1R
footprint Ê50-35-1020-Ã_K5035-1R1
footprint Ê50-35-1020-Ã_Primary
pins: 1, 2

## Ê50-35-330ÌÊÔ-50Â-1016
designator C?  (value not drawn)
Value: *
footprint Ê50-35-1020_K5035-1R
footprint Ê50-35-1020_K5035-1R1
footprint Ê50-35-1020_Primary
pins: 1, 2

## Ê50-35-330ÌÊÔ-50Â-1016-Ã
designator C?  (value not drawn)
Value: *
footprint Ê50-35-1020-Ã_K5035-1R
footprint Ê50-35-1020-Ã_K5035-1R1
footprint Ê50-35-1020-Ã_Primary
pins: 1, 2

## Ê50-35-330ÌÊÔ-50Â-1020
designator C?  (value not drawn)
Value: *
footprint Ê50-35-1020_K5035-1R
footprint Ê50-35-1020_K5035-1R1
footprint Ê50-35-1020_Primary
pins: 1, 2

## Ê50-35-330ÌÊÔ-50Â-1020-Ã
designator C?  (value not drawn)
Value: *
footprint Ê50-35-1020-Ã_K5035-1R
footprint Ê50-35-1020-Ã_K5035-1R1
footprint Ê50-35-1020-Ã_Primary
pins: 1, 2

## Ê50-35-330ÌÊÔ-63Â-1020
designator C?  (value not drawn)
Value: *
footprint Ê50-35-1020_K5035-1R
footprint Ê50-35-1020_K5035-1R1
footprint Ê50-35-1020_Primary
pins: 1, 2

## Ê50-35-330ÌÊÔ-63Â-1020-Ã
designator C?  (value not drawn)
Value: *
footprint Ê50-35-1020-Ã_K5035-1R
footprint Ê50-35-1020-Ã_K5035-1R1
footprint Ê50-35-1020-Ã_Primary
pins: 1, 2